# Altium footprint library PCBLIB.PcbLib: 557 footprints (part 21 of 36)
Each footprint in its own frame and in the unit in brackets; x right, y up, seen from the top. Pads: shape width x height; smd on the part's side, far side on the other; paste and mask are expansions set on the pad; w line width, h text height; cw(c..) or ccw(c..) is an arc to the next point about the centre after c.
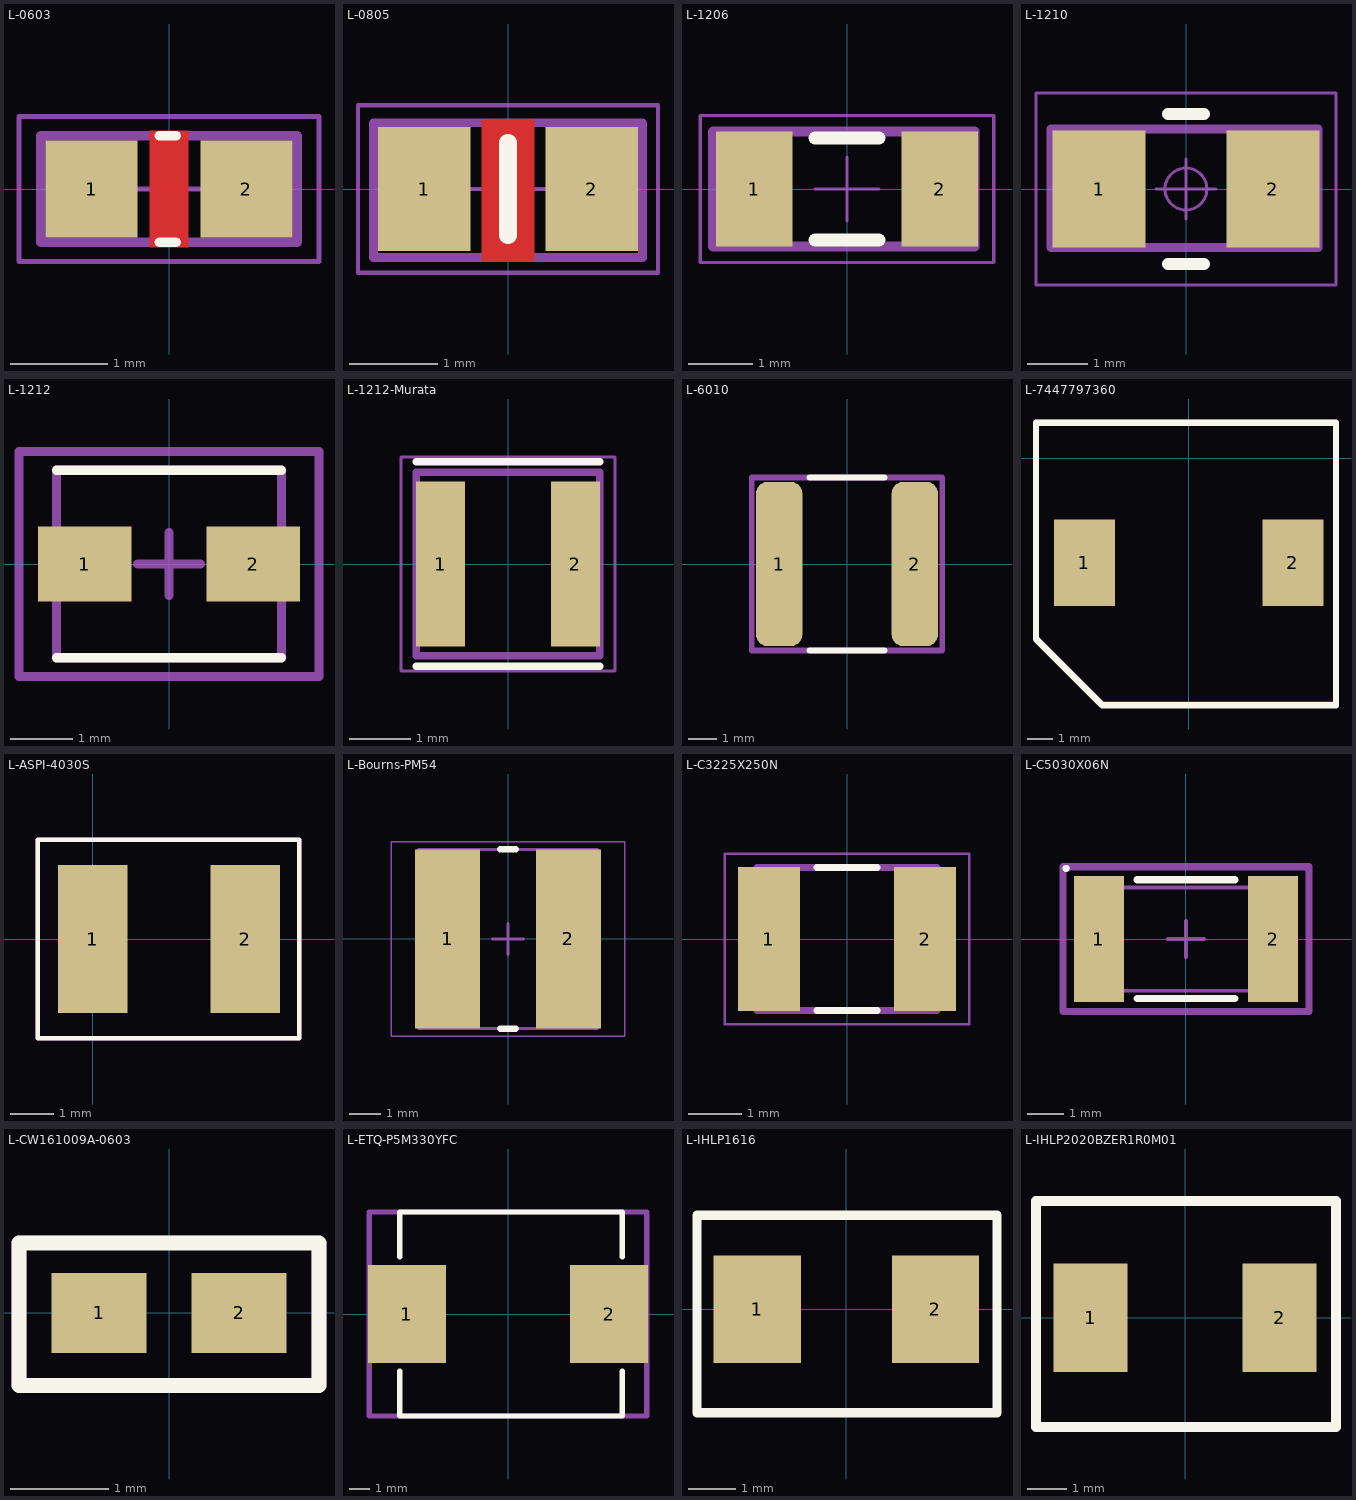
[diagram p20: the footprints below, top view; thin cyan lines are the x and y axes]

## L-0603 [mm]
pads (2):
  rect 0.95x1 smd: 1(-0.8,0) 2(0.8,0)
Top Layer:
  pour cut-out: -0.2,0.6 -0.2,-0.6 0.2,-0.6 0.2,0.6
Top Overlay:
  lines w0.1: -0.1,-0.55 0.075,-0.55 ; -0.1,0.55 0.075,0.55
Top Paste:
  region: 0.356,0.33 1.118,0.33 1.118,0.102 0.356,0.102
  region: 0.356,-0.025 1.118,-0.025 1.118,-0.254 0.356,-0.254
Mechanical 15:
  lines w0.05: -0.5,0 0.5,0 ; 0,-0.5 0,0.5 ; -1.55,-0.75 -1.55,0.75 1.55,0.75 1.55,-0.75 -1.55,-0.75
ASM Top:
  lines w0.1: -1.325,-0.55 1.325,-0.55 1.325,0.55 -1.325,0.55 -1.325,-0.55
  text ".designator" at -0.6,-0.2 h0.8
3D body "INDC1608X95N EIA 0603.step": height 0.81, standoff 0.01, extent -0.8,-0.482 0.8,0.468

## L-0805 [mm]
pads (2):
  rect 1.05x1.4 smd: 1(-0.95,0) 2(0.95,0)
Top Layer:
  pour cut-out: -0.3,0.788 -0.3,-0.825 0.3,-0.825 0.3,0.787
Top Overlay:
  lines w0.2: 0,-0.525 0,0.525
Mechanical 15:
  lines w0.05: -0.5,0 0.5,0 ; 0,-0.5 0,0.5 ; -1.7,-0.95 1.7,-0.95 1.7,0.95 -1.7,0.95 -1.7,-0.95
ASM Top:
  lines w0.1: -1.525,-0.775 1.525,-0.775 1.525,0.75 -1.525,0.75 -1.525,-0.775
  text ".designator" at -1.397,-0.483 h0.8
3D body "INDC2012X95N EIA 0805.step": height 0.96, standoff 0.01, extent -1,-0.61 1,0.59

## L-1206 [mm]
pads (2):
  rect 1.2x1.8 smd: 1(-1.45,0) 2(1.45,0)
Top Overlay:
  lines w0.2: -0.5,-0.8 0.5,-0.8 ; -0.5,0.8 0.5,0.8
Mechanical 15:
  lines w0.05: -0.5,0 0.5,0 ; 0,-0.5 0,0.5 ; -2.3,-1.15 2.3,-1.15 2.3,1.15 -2.3,1.15 -2.3,-1.15
ASM Top:
  lines w0.152: -2.1,-0.9 2,-0.9 2,0.9 -2.1,0.9 -2.1,-0.9
  text ".designator" at -0.7,-0.2 h0.8
3D body "INDC3216X130N EIA 1206.step": height 1.31, standoff 0.01, extent -1.6,-0.8 1.6,0.8

## L-1210 [mm]
pads (2):
  rect 1.55x1.95 smd: 1(-1.45,0) 2(1.45,0)
Top Overlay:
  lines w0.2: -0.3,-1.25 0.3,-1.25 ; -0.3,1.25 0.3,1.25
Mechanical 15:
  circle w0.05: c0,0 r0.35
  lines w0.05: -0.5,0 0.5,0 ; 0,-0.5 0,0.5 ; -2.5,-1.6 2.5,-1.6 2.5,1.6 -2.5,1.6 -2.5,-1.6
ASM Top:
  lines w0.152: -2.25,-0.975 2.2,-0.975 2.2,1 -2.25,1 -2.25,-0.975
  text ".designator" at -0.8,-0.3 h0.8
3D body "INDC3225X135N EIA 1210.step": height 1.36, standoff 0.01, extent -1.6,-1.245 1.6,1.255

## L-1212 [mm]
height 2
pads (2):
  rect 1.5x1.2 smd: 1(-1.35,0) 2(1.35,0)
Top Overlay:
  lines w0.15: -1.8,-1.5 1.8,-1.5 ; -1.8,1.5 1.8,1.5
Mechanical 15:
  lines w0.15: -0.5,0 0.5,0 ; 0,-0.5 0,0.5 ; -2.4,-1.8 -2.4,1.8 2.4,1.8 2.4,-1.8 -2.4,-1.8
ASM Top:
  lines w0.15: -1.8,-1.5 -1.8,1.5 1.8,1.5 1.8,-1.5 -1.8,-1.5
  text ".designator" at -0.6,-0.2 h1.5
3D body "IHLP1212BZER2R2M11.stp": height 2, standoff 0, extent -1.825,-1.5 1.825,1.5

## L-1212-Murata [mm]
pads (2):
  rect 0.8x2.7 smd: 1(-1.1,0) 2(1.1,0)
Top Overlay:
  lines w0.127: -1.5,-1.67 1.5,-1.67 ; -1.5,1.67 1.5,1.67
Mechanical 13:
  lines w0.127: -1.5,-1.5 -1.5,1.5 ; 1.5,-1.5 1.5,1.5
Mechanical 15:
  lines w0.05: -1.75,-1.75 1.75,-1.75 1.75,1.75 -1.75,1.75 -1.75,-1.75
ASM Top:
  lines w0.127: -1.5,-1.5 1.5,-1.5 ; -1.5,1.5 1.5,1.5
  text ".designator" at -0.95,-0.183 h0.8
3D body "74404032010_Download_STP_WE-LQS-3015_rev1.stp": height 1.51, standoff 0.01, extent -1.5,-1.5 1.5,1.5

## L-6010 [mm] "2 Leads,  6mm X 6mm"
height 1
pads (2):
  rrect50% 1.6x5.7 smd: 1(-2.35,0) 2(2.35,0)
Top Overlay:
  lines w0.2: -1.3,-3 1.3,-3 ; -1.3,3 1.3,3
ASM Top:
  lines w0.2: -3.3,-3 -3.3,3 3.3,3 3.3,-3 -3.3,-3
  text ".designator" at -0.9,-0.3 h0.8
3D body "User Library-DJNR6028.STEP": height 2.58, standoff 0, extent -3,-3.073 3,3.073

## L-7447797360 [mm]
pads (2):
  rect 2.4x3.4 smd: 1(-4.1,-4.1) 2(4.1,-4.1)
Top Overlay:
  lines w0.254: -6,-5.114 -6,1.4 5.8,1.4 5.8,-9.7 ; -6,-5.1 -6,-7.1 -3.4,-9.7 -3.1,-9.7 5.8,-9.7 ; 5.8,-9.7 5.765,-9.7 5.8,-9.7
ASM Top:
  lines w0.254: -6,-5.099 -6,1.4 5.8,1.4 5.8,-9.685 ; -6,-5.085 -6,-7.085 -3.4,-9.685 -3.1,-9.685 5.8,-9.685 ; 5.8,-9.685 5.765,-9.685 5.8,-9.685
  text ".designator" at 0.4,-5 h0.8
3D body "7447797022_Download_STP_WE-PDF-1045_rev1.stp": height 4.45, standoff -0.05, extent -5.1,-9.2 5.1,1

## L-ASPI-4030S [mil]
pads (2):
  rect 63x134 smd: 1(0,0) 2(138,0)
Top Overlay:
  lines w4: -50,-90 -50,90 187,90 187,-90 -50,-90
ASM Top:
  lines w4: -50,-90 187,-90 187,90 -50,90 -50,-90
  text ".designator" at -31,-52 h31.5
3D body "ASPI-4030S.STEP": height 118.62, standoff 0.5, extent -5.74,-78.73 151.74,78.75

## L-Bourns-PM54 [mm] "Precision Wire Wound Inductor, 2-Leads, Body 5,80x5,80mm, IPC Medium Density"
height 4.8
pads (2):
  rect 2.1x5.8 smd: 1(-1.95,0) 2(1.95,0)
Top Overlay:
  lines w0.2: -0.25,-2.9 0.25,-2.9 ; -0.25,2.9 0.25,2.9
Mechanical 15:
  lines w0.05: -3.775,-3.15 3.775,-3.15 3.775,3.15 -3.775,3.15 -3.775,-3.15
  lines w0.1: -0.5,0 0.5,0 ; 0,-0.5 0,0.5
ASM Top:
  lines w0.1: -2.9,-2.9 -2.9,2.9 2.9,2.9 2.9,-2.9 -2.9,-2.9
  text ".designator" at -0.2,-0.1 h0.8
3D body "pm54.stp": height 4.81, standoff 0.01, extent -2.9,-2.9 2.9,2.9

## L-C3225X250N [mm]
pads (2):
  rect 1.17x2.72 smd: 1(-1.474,0) 2(1.474,0)
Top Overlay:
  lines w0.127: -0.57,-1.35 0.57,-1.35 ; -0.57,1.35 0.57,1.35
Mechanical 15:
  lines w0.05: -2.308,-1.608 -2.308,1.608 2.308,1.608 2.308,-1.608 -2.308,-1.608
ASM Top:
  lines w0.127: -1.7,-1.35 -1.7,1.35 1.7,1.35 1.7,-1.35 -1.7,-1.35
  text ".designator" at -1.05,-0.183 h0.8
3D body "step_temp.STEP": height 2.5, standoff 0, extent -1.6,-1.25 1.6,1.25

## L-C5030X06N [mm] "Chip Inductor, 2-Leads, Body 5.00x3.00mm, IPC Medium Density"
height 0.65
pads (2):
  rect 1.39x3.48 smd: 1(-2.405,0) 2(2.405,0)
Top Overlay:
  circle w0.1: c-3.312,1.952 r0.05
  lines w0.2: -1.35,-1.64 1.35,-1.64 ; -1.35,1.64 1.35,1.64
Mechanical 13:
  lines w0.1: -2.425,-1.425 2.425,-1.425 2.425,1.425 -2.425,1.425 -2.425,-1.425
Mechanical 15:
  lines w0.05: -3.35,-2 3.35,-2 3.35,2 -3.35,2 -3.35,-2
  lines w0.1: -0.5,0 0.5,0 ; 0,-0.5 0,0.5
ASM Top:
  lines w0.2: -3.4,-2 -3.4,2 3.4,2 3.4,-2 -3.4,-2
  text ".designator" at -0.7,-0.2 h0.8
3D body: height 0.65, standoff 0, extent 1.725,-1.425 2.425,1.425
3D body: height 0.65, standoff 0, extent -2.425,-1.425 -1.725,1.425
3D body: height 0.65, standoff 0, extent -1.725,-1.425 1.725,1.425

## L-CW161009A-0603 [mil]
pads (2):
  rect 38x32 smd mask+1.97: 1(-28,0)
  rect 38x32 smd paste-100 mask+1.97: 2(28,0)
Top Overlay:
  lines w6: -60,-29 -60,28 60,28 60,-29 -60,-29
Top Paste:
  region: 14,-1 44,-1 44,-10 14,-10
  region: 14,13 44,13 44,4 14,4
ASM Top:
  lines w5.91: -60,-29 -60,28 60,28 60,-29 -60,-29
  text ".designator" at -26,-7 h31.5
3D body "CW161009A.stp": height 37.47, standoff -3.44, extent -33.25,-22.34 35.25,23

## L-ETQ-P5M330YFC [mm]
pads (2):
  rect 3.8x4.8 smd: 1(-4.95,0) 2(4.95,0)
Top Overlay:
  lines w0.254: -5.3,-2.8 -5.3,-5 5.6,-5 5.6,-2.8 ; -5.3,2.8 -5.3,5 5.6,5 5.6,2.8
ASM Top:
  lines w0.254: -6.8,-4.962 -6.762,-5 6.8,-5 6.8,5 -6.8,5 -6.8,-5 -6.8,-4.924
  text ".designator" at -1,-0.3 h0.8
3D body "PCC-M1054M.STEP": height 5.4, standoff 0.01, extent -5.3,-5 5.6,5

## L-IHLP1616 [mil]
pads (2):
  rect 73x90 smd: 1(-74.5,0) 2(74.5,0)
Top Overlay:
  lines w7.87: -125,-86.61 -125,78.74 125.98,78.74 125.98,-86.61 -125,-86.61
ASM Top:
  lines w4: -125,-86.61 125.98,-86.61 125.98,78.74 -125,78.74 -125,-86.61
  text ".designator" at -109,-41 h31.5
3D body "IHLP-1616BZ-01.STEP": height 79.24, standoff 0.5, extent -87,-82.92 88.19,76.92

## L-IHLP2020BZER1R0M01 [mm]
pads (2):
  rect 1.905x2.79 smd: 1(-2.425,0) 2(2.426,0)
Top Overlay:
  lines w0.254: -3.825,-2.8 -3.825,3 3.875,3 3.875,-2.8 -3.825,-2.8
ASM Top:
  lines w0.254: -3.825,-2.8 3.875,-2.8 3.875,3 -3.825,3 -3.825,-2.8
  text ".designator" at -0.5,-0.1 h0.8
3D body "IHLP-2020BZ-01.STEP": height 2.01, standoff 0.01, extent -2.67,-2.49 2.82,2.69